# Altium footprint library PHANTOM_FOOTPRINTS.PcbLib: 44 footprints (part 2 of 3)
Each footprint in its own frame and in the unit in brackets; x right, y up, seen from the top. Pads: shape width x height; smd on the part's side, far side on the other; paste and mask are expansions set on the pad; w line width, h text height; cw(c..) or ccw(c..) is an arc to the next point about the centre after c.
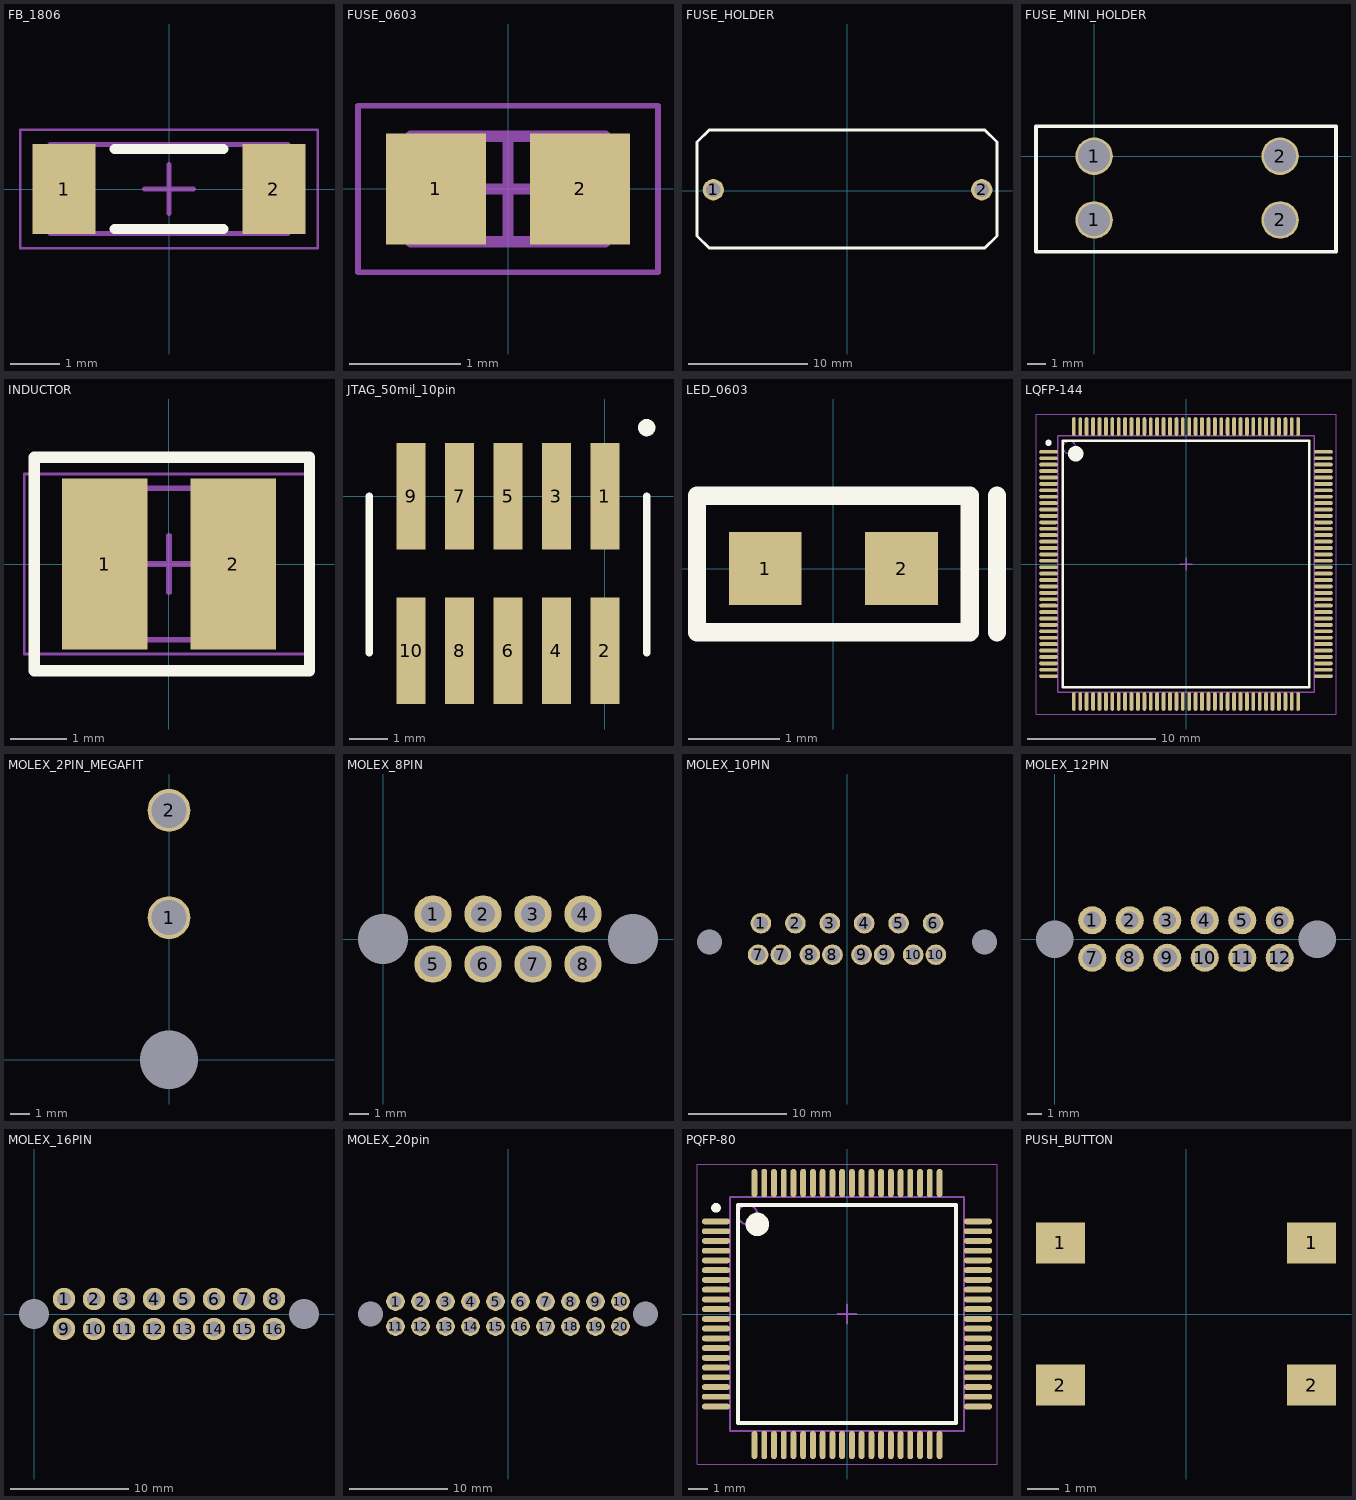
[diagram p1: the footprints below, top view; thin cyan lines are the x and y axes]

## FB_1806 [mm] "Chip Inductor, 2-Leads, Body 4.50x1.60mm, IPC Medium Density"
height 1.3
pads (2):
  rect 1.27x1.82 smd: 1(-2.12,0) 2(2.12,0)
Top Overlay:
  lines w0.2: -1.1,-0.81 1.1,-0.81 ; -1.1,0.81 1.1,0.81
Mechanical 13:
  lines w0.1: -2.4,-0.9 2.4,-0.9 2.4,0.9 -2.4,0.9 -2.4,-0.9
Mechanical 15:
  lines w0.05: -3,-1.2 3,-1.2 3,1.2 -3,1.2 -3,-1.2
  lines w0.1: -0.5,0 0.5,0 ; 0,-0.5 0,0.5
3D body "INDC4516X13N.step": height 1.3, standoff 0, extent -2.4,-0.9 2.4,0.9

## FUSE_0603 [mm] "Chip Diode, 2-Leads, Body 1.60x0.80mm, IPC Medium Density"
height 0.48
pads (2):
  rect 0.9x1 smd: 1(-0.65,0) 2(0.65,0)
Mechanical 13:
  lines w0.1: -0.875,-0.475 0.875,-0.475 0.875,0.475 -0.875,0.475 -0.875,-0.475
Mechanical 15:
  lines w0.05: -1.35,-0.75 1.35,-0.75 1.35,0.75 -1.35,0.75 -1.35,-0.75
  lines w0.1: -0.475,0 0.475,0 ; 0,-0.475 0,0.475
3D body "DIOC1608X05N.step": height 0.48, standoff 0, extent -0.875,-0.475 0.875,0.475

## FUSE_HOLDER [mil]
pads (2):
  round 70 hole 48: 1(-441.14,2.56) 2(444.69,2.56)
Top Overlay:
  lines w10: -495,-150 -455,-190 455,-190 495,-150 495,160 455,200 -455,200 -495,160 -495,-150
3D body "31-8201.stp": height 452.76, standoff -157.48, extent -452.96,-185.44 456.49,192.52

## FUSE_MINI_HOLDER [mm]
pads (4):
  round 2 hole 1.7: 1(0,-3.4) 1(0,0) 2(9.92,-3.4) 2(9.92,0)
Top Overlay:
  lines w0.2: -3.1,-5.1 -3.1,1.6 12.9,1.6 12.9,-5.1 -3.1,-5.1
3D body "keystone-PN3568.STEP": height 7.36, standoff -2.8, extent -3.101,-5.086 12.901,1.645

## INDUCTOR [mm] "Precision Wire Wound Inductor, 2-Leads, Body 3.20x2.50mm, IPC Medium Density"
height 2.29
pads (2):
  rect 1.52x3.05 smd: 1(-1.145,0) 2(1.145,0)
Top Overlay:
  lines w0.2: -2.4,-1.9 -2.4,1.9 2.5,1.9 2.5,-1.9 -2.4,-1.9
Mechanical 13:
  lines w0.1: -1.75,-1.35 -1.75,1.35 1.75,1.35 1.75,-1.35 -1.75,-1.35
Mechanical 15:
  lines w0.05: -2.575,-1.6 -2.575,1.6 2.575,1.6 2.575,-1.6 -2.575,-1.6
  lines w0.1: -0.5,0 0.5,0 ; 0,-0.5 0,0.5
3D body "INDP3225X23N.step": height 2.39, standoff 0, extent -1.7,-1.25 1.7,1.25

## JTAG_50mil_10pin [mil]
pads (10):
  rect 30x110 smd: 1(0,0) 2(0,-159.84) 3(-50,0) 4(-50,-159.84) 5(-100,0) 6(-100,-159.84) 7(-150,0) 8(-150,-159.84) 9(-200,0) 10(-200,-159.84)
Top Overlay:
  circle w10: c43.31,70.87 r3.94
  lines w7.87: -243.31,-161.42 -243.31,0 ; 43.31,-161.42 43.31,0
3D body "FTSH-105-01-L-DV-K-TR.stp": height 240.75, standoff -0.25, extent -223.42,-193.74 26.57,36.26

## LED_0603 [mm]
pads (2):
  rect 0.8x0.8 smd: 1(-0.75,0) 2(0.75,0)
Top Overlay:
  lines w0.2: 1.8,-0.7 1.8,0.8 ; -1.5,-0.7 1.5,-0.7 1.5,0.8 -1.5,0.8 -1.5,-0.7

## LQFP-144 [mm] "TSQFP, 144-Leads, Body 20.00x20.00mm, Pitch 0.50mm, IPC Medium Density"
height 1.6
pads (144):
  oval 1.45x0.3 smd: 1(-10.725,8.75) 2(-10.725,8.25) 3(-10.725,7.75) 4(-10.725,7.25) 5(-10.725,6.75) 6(-10.725,6.25) 7(-10.725,5.75) 8(-10.725,5.25) 9(-10.725,4.75) 10(-10.725,4.25) 11(-10.725,3.75) 12(-10.725,3.25) 13(-10.725,2.75) 14(-10.725,2.25) 15(-10.725,1.75) 16(-10.725,1.25) 17(-10.725,0.75) 18(-10.725,0.25) 19(-10.725,-0.25) 20(-10.725,-0.75) 21(-10.725,-1.25) 22(-10.725,-1.75) 23(-10.725,-2.25) 24(-10.725,-2.75) 25(-10.725,-3.25) 26(-10.725,-3.75) 27(-10.725,-4.25) 28(-10.725,-4.75) 29(-10.725,-5.25) 30(-10.725,-5.75) 31(-10.725,-6.25) 32(-10.725,-6.75) 33(-10.725,-7.25) 34(-10.725,-7.75) 35(-10.725,-8.25) 36(-10.725,-8.75) 73(10.725,-8.75) 74(10.725,-8.25) 75(10.725,-7.75) 76(10.725,-7.25) 77(10.725,-6.75) 78(10.725,-6.25) 79(10.725,-5.75) 80(10.725,-5.25) 81(10.725,-4.75) 82(10.725,-4.25) 83(10.725,-3.75) 84(10.725,-3.25) 85(10.725,-2.75) 86(10.725,-2.25) 87(10.725,-1.75) 88(10.725,-1.25) 89(10.725,-0.75) 90(10.725,-0.25) 91(10.725,0.25) 92(10.725,0.75) 93(10.725,1.25) 94(10.725,1.75) 95(10.725,2.25) 96(10.725,2.75) 97(10.725,3.25) 98(10.725,3.75) 99(10.725,4.25) 100(10.725,4.75) 101(10.725,5.25) 102(10.725,5.75) 103(10.725,6.25) 104(10.725,6.75) 105(10.725,7.25) 106(10.725,7.75) 107(10.725,8.25) 108(10.725,8.75)
  oval 0.3x1.45 smd: 37(-8.75,-10.725) 38(-8.25,-10.725) 39(-7.75,-10.725) 40(-7.25,-10.725) 41(-6.75,-10.725) 42(-6.25,-10.725) 43(-5.75,-10.725) 44(-5.25,-10.725) 45(-4.75,-10.725) 46(-4.25,-10.725) 47(-3.75,-10.725) 48(-3.25,-10.725) 49(-2.75,-10.725) 50(-2.25,-10.725) 51(-1.75,-10.725) 52(-1.25,-10.725) 53(-0.75,-10.725) 54(-0.25,-10.725) 55(0.25,-10.725) 56(0.75,-10.725) 57(1.25,-10.725) 58(1.75,-10.725) 59(2.25,-10.725) 60(2.75,-10.725) 61(3.25,-10.725) 62(3.75,-10.725) 63(4.25,-10.725) 64(4.75,-10.725) 65(5.25,-10.725) 66(5.75,-10.725) 67(6.25,-10.725) 68(6.75,-10.725) 69(7.25,-10.725) 70(7.75,-10.725) 71(8.25,-10.725) 72(8.75,-10.725) 109(8.75,10.725) 110(8.25,10.725) 111(7.75,10.725) 112(7.25,10.725) 113(6.75,10.725) 114(6.25,10.725) 115(5.75,10.725) 116(5.25,10.725) 117(4.75,10.725) 118(4.25,10.725) 119(3.75,10.725) 120(3.25,10.725) 121(2.75,10.725) 122(2.25,10.725) 123(1.75,10.725) 124(1.25,10.725) 125(0.75,10.725) 126(0.25,10.725) 127(-0.25,10.725) 128(-0.75,10.725) 129(-1.25,10.725) 130(-1.75,10.725) 131(-2.25,10.725) 132(-2.75,10.725) 133(-3.25,10.725) 134(-3.75,10.725) 135(-4.25,10.725) 136(-4.75,10.725) 137(-5.25,10.725) 138(-5.75,10.725) 139(-6.25,10.725) 140(-6.75,10.725) 141(-7.25,10.725) 142(-7.75,10.725) 143(-8.25,10.725) 144(-8.75,10.725)
Top Overlay:
  circle w0.6: c-8.6,8.6 r0.3
  circle w0.25: c-10.725,9.45 r0.125
  lines w0.2: -9.6,-9.6 9.6,-9.6 9.6,9.6 -9.6,9.6 -9.6,-9.6
Mechanical 13:
  circle w0.1: c-9.1,9.1 r0.5
  lines w0.1: -10,-10 10,-10 10,10 -10,10 -10,-10
Mechanical 15:
  lines w0.05: -11.7,-11.7 11.7,-11.7 11.7,11.7 -11.7,11.7 -11.7,-11.7
  lines w0.1: -0.5,0 0.5,0 ; 0,-0.5 0,0.5
3D body "LQFP-144pin.SLDPRT": height 1.45, standoff -0.15, extent -10.9,-11 11.1,11

## MOLEX_2PIN_MEGAFIT [mm]
pads (3):
  round 2.2 hole 1.8: 1(0,7.3) 2(0,12.8)
  round 0 hole 3: ""(0,0)
3D body "molex_megafit.stp": height 14.75, standoff -3.38, extent -4.1,-8.581 4.249,13.381

## MOLEX_8PIN [mm]
pads (10):
  round 1.9 hole 1.2: 1(2.54,1.27) 2(5.08,1.27) 3(7.62,1.27) 4(10.16,1.27)
  round 1.9 hole 1.3: 5(2.54,-1.27) 6(5.08,-1.27) 7(7.62,-1.27) 8(10.16,-1.27)
  round 0 hole 2.54: ""(0,0) ""(12.7,0)
3D body "MOLEX_8PIN.stp": height 21.8, standoff -3.69, extent -3.1,-31.882 15.76,3.282

## MOLEX_10PIN [mm]
pads (16):
  round 2.1 hole 1.48: 1(-8.75,24.56) 2(-5.25,24.56) 3(-1.75,24.56) 4(1.75,24.56) 5(5.25,24.56) 6(8.75,24.56) 7(-9.025,21.36) 7(-6.725,21.36) 8(-3.775,21.36) 8(-1.475,21.36) 9(1.475,21.36) 9(3.775,21.36) 10(6.725,21.36) 10(9.025,21.36)
  round 0 hole 2.54: ""(-13.97,22.63) ""(13.97,22.63)
3D body "346960101.stp": height 21.66, standoff -3.9, extent -17.05,-9.26 17.05,25.902

## MOLEX_12PIN [mm]
pads (14):
  round 1.9 hole 1.2: 1(2.54,1.27) 2(5.08,1.27) 3(7.62,1.27) 4(10.16,1.27) 5(12.7,1.27) 6(15.24,1.27)
  round 1.9 hole 1.3: 7(2.54,-1.27) 8(5.08,-1.27) 9(7.62,-1.27) 10(10.16,-1.27) 11(12.7,-1.27) 12(15.24,-1.27)
  round 0 hole 2.54: ""(0,0) ""(17.78,0)
3D body "molex_12pin.stp": height 22.06, standoff -3.4, extent -3.04,-31.882 20.9,3.282

## MOLEX_16PIN [mm]
pads (18):
  round 1.9 hole 1.2: 1(2.54,1.27) 2(5.08,1.27) 3(7.62,1.27) 4(10.16,1.27) 5(12.7,1.27) 6(15.24,1.27) 7(17.78,1.27) 8(20.32,1.27)
  round 1.9 hole 1.3: 9(2.54,-1.27) 10(5.08,-1.27) 11(7.62,-1.27) 12(10.16,-1.27) 13(12.7,-1.27) 14(15.24,-1.27) 15(17.78,-1.27) 16(20.32,-1.27)
  round 0 hole 2.54: ""(0,0) ""(22.86,0)
3D body "molex_16pin.stp": height 22.16, standoff -3.4, extent -3.12,-31.882 25.9,3.282

## MOLEX_20pin [mm]
pads (22):
  round 1.9 hole 1.2: 1(-11.43,23.9) 2(-8.89,23.9) 3(-6.35,23.9) 4(-3.81,23.9) 5(-1.27,23.9) 6(1.27,23.9) 7(3.81,23.9) 8(6.35,23.9) 9(8.89,23.9) 10(11.43,23.9)
  round 1.9 hole 1.3: 11(-11.43,21.36) 12(-8.89,21.36) 13(-6.35,21.36) 14(-3.81,21.36) 15(-1.27,21.36) 16(1.27,21.36) 17(3.81,21.36) 18(6.35,21.36) 19(8.89,21.36) 20(11.43,21.36)
  round 0 hole 2.54: ""(-13.97,22.63) ""(13.97,22.63)
3D body "346916200.stp": height 21.16, standoff -4.4, extent -17.05,-9.26 17.05,25.6

## PQFP-80 [mm] "TSQFP, 80-Leads, Body 12.00x12.00mm, Pitch 0.50mm, IPC Medium Density"
height 1.2
pads (80):
  oval 1.45x0.3 smd: 1(-6.725,4.75) 2(-6.725,4.25) 3(-6.725,3.75) 4(-6.725,3.25) 5(-6.725,2.75) 6(-6.725,2.25) 7(-6.725,1.75) 8(-6.725,1.25) 9(-6.725,0.75) 10(-6.725,0.25) 11(-6.725,-0.25) 12(-6.725,-0.75) 13(-6.725,-1.25) 14(-6.725,-1.75) 15(-6.725,-2.25) 16(-6.725,-2.75) 17(-6.725,-3.25) 18(-6.725,-3.75) 19(-6.725,-4.25) 20(-6.725,-4.75) 41(6.725,-4.75) 42(6.725,-4.25) 43(6.725,-3.75) 44(6.725,-3.25) 45(6.725,-2.75) 46(6.725,-2.25) 47(6.725,-1.75) 48(6.725,-1.25) 49(6.725,-0.75) 50(6.725,-0.25) 51(6.725,0.25) 52(6.725,0.75) 53(6.725,1.25) 54(6.725,1.75) 55(6.725,2.25) 56(6.725,2.75) 57(6.725,3.25) 58(6.725,3.75) 59(6.725,4.25) 60(6.725,4.75)
  oval 0.3x1.45 smd: 21(-4.75,-6.725) 22(-4.25,-6.725) 23(-3.75,-6.725) 24(-3.25,-6.725) 25(-2.75,-6.725) 26(-2.25,-6.725) 27(-1.75,-6.725) 28(-1.25,-6.725) 29(-0.75,-6.725) 30(-0.25,-6.725) 31(0.25,-6.725) 32(0.75,-6.725) 33(1.25,-6.725) 34(1.75,-6.725) 35(2.25,-6.725) 36(2.75,-6.725) 37(3.25,-6.725) 38(3.75,-6.725) 39(4.25,-6.725) 40(4.75,-6.725) 61(4.75,6.725) 62(4.25,6.725) 63(3.75,6.725) 64(3.25,6.725) 65(2.75,6.725) 66(2.25,6.725) 67(1.75,6.725) 68(1.25,6.725) 69(0.75,6.725) 70(0.25,6.725) 71(-0.25,6.725) 72(-0.75,6.725) 73(-1.25,6.725) 74(-1.75,6.725) 75(-2.25,6.725) 76(-2.75,6.725) 77(-3.25,6.725) 78(-3.75,6.725) 79(-4.25,6.725) 80(-4.75,6.725)
Top Overlay:
  circle w0.25: c-6.725,5.45 r0.125
  circle w0.6: c-4.6,4.6 r0.3
  lines w0.2: -5.6,-5.6 -5.6,5.6 5.6,5.6 5.6,-5.6 -5.6,-5.6
Mechanical 13:
  circle w0.1: c-5.1,5.1 r0.5
  lines w0.1: -6,-6 -6,6 6,6 6,-6 -6,-6
Mechanical 15:
  lines w0.05: -7.7,-7.7 -7.7,7.7 7.7,7.7 7.7,-7.7 -7.7,-7.7
  lines w0.1: -0.5,0 0.5,0 ; 0,-0.5 0,0.5
3D body "TSQFP50P1400X1400X120-80N.step": height 1.2, standoff 0, extent -7,-7 7,7

## PUSH_BUTTON [mm]
pads (4):
  rect 1.55x1.3 smd: 1(-3.975,2.25) 1(3.975,2.25) 2(-3.975,-2.25) 2(3.975,-2.25)
3D body "push button.stp": height 4.3, standoff 0, extent -4.5,-3 4.5,3